# Altium footprint library 我的元件库02.PcbLib: 300 footprints (part 2 of 19)
Each footprint in its own frame and in the unit in brackets; x right, y up, seen from the top. Pads: shape width x height; smd on the part's side, far side on the other; paste and mask are expansions set on the pad; w line width, h text height; cw(c..) or ccw(c..) is an arc to the next point about the centre after c.
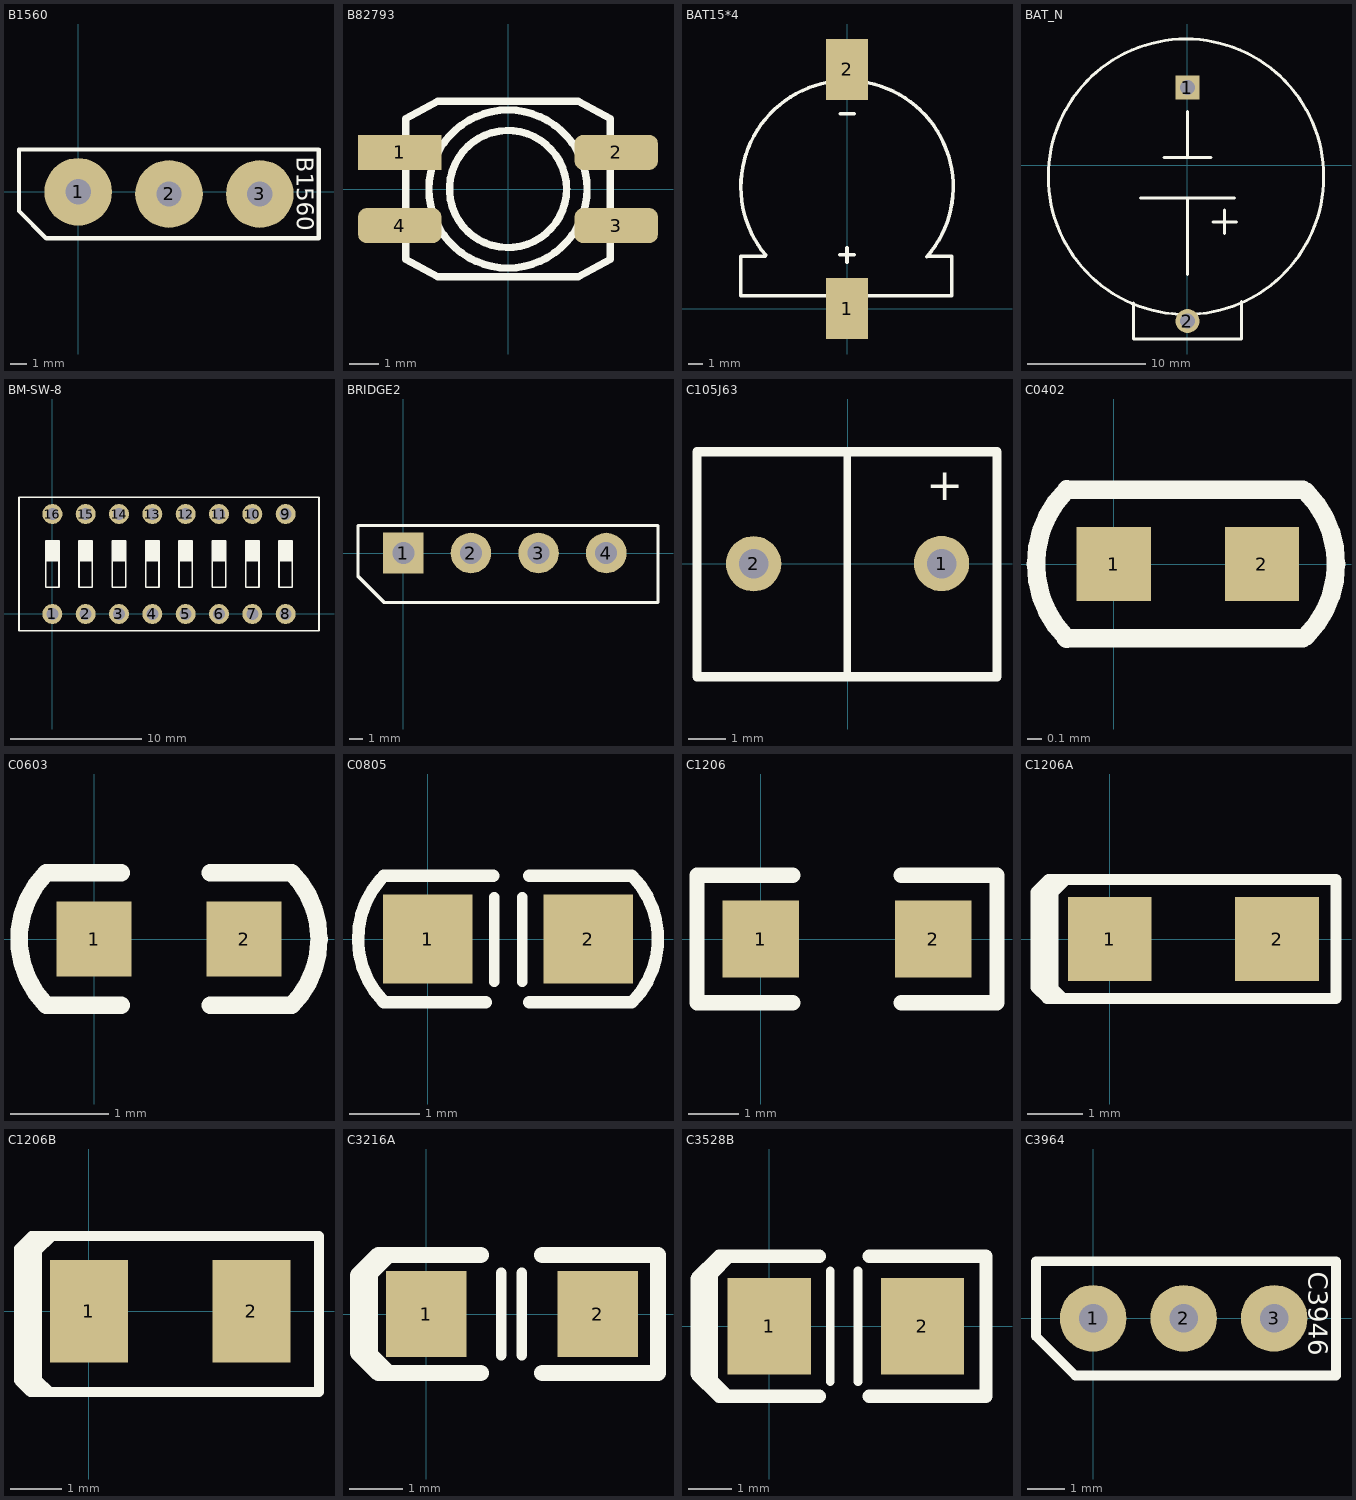
[diagram p1: the footprints below, top view; thin cyan lines are the x and y axes]

## B1560 [mil]
pads (3):
  round 160 hole 60: 1(0,0) 2(215,-5) 3(430,-5)
Top Overlay:
  lines w3.15: 565,100 570,95
  lines w10: -140,99.75 -140,-45.38 -75.38,-110 568.98,-110 ; -139.75,100 569.49,100 ; -85.13,100 569.49,100 ; 569.49,-109.49 569.49,100
  text "B1560" at 517.87,83.62 h40
Bottom Overlay:
  lines w3.15: 565,100 570,95
  lines w10: -140,99.75 -140,-45.38 -75.38,-110 568.98,-110 ; -139.75,100 569.49,100 ; -85.13,100 569.49,100 ; 569.49,-109.49 569.49,100

## B82793 [mm] "CAN总线滤波器"
height 4.8
pads (4):
  rect 2.85x1.2 smd: 1(-3.7,1.25)
  rrect50% 2.85x1.2 smd: 2(3.7,1.25) 3(3.7,-1.25) 4(-3.7,-1.25)
Top Overlay:
  circle w0.254: c0,0 r2.7
  circle w0.254: c0,0 r2
  lines w0.254: -3.5,-2.4 -2.4,-3 2.4,-3 3.5,-2.4 3.5,2.4 2.4,3 -2.4,3 -3.5,2.4 -3.5,-2.4

## BAT15*4 [mm]
pads (2):
  rect 3x4.3 smd: 1(0,0) 2(0,16.9)
Top Overlay:
  lines w0.254: -5.789,3.7 -7.5,3.7 -7.5,0.9 7.4,0.9 7.4,3.7 5.687,3.7 ; -5.731,3.758 cw(c0,8.6) 5.646,3.659 ; -0.508,3.8 0.508,3.8 ; -0.491,13.775 0.525,13.775 ; 0,3.292 0,4.308

## BAT_N [mil] "CR2032电池座（未加焊）"
pads (2):
  rect 80x80 hole 50: 1(0.21,260.42)
  round 80 hole 50: 2(0.21,-519.58)
Top Overlay:
  circle w10: c-4.79,-37.58 r460
  lines w10: -179.79,-459.58 -179.79,-579.58 180.21,-579.58 180.21,-453.58 ; -156.79,-108.58 157.21,-108.58 ; -77.79,27.34 78.21,27.34 ; 0.21,-364.58 0.21,-108.58 ; 0.21,28.73 0.21,180.42 ; 85.43,-188.34 164.43,-188.34 ; 124.43,-227.34 124.43,-148.34
3D body: height 301.57, standoff -181.11, extent -435.69,-565.55 435.69,385.94

## BM-SW-8 [mil]
pads (16):
  round 60 hole 36: 1(0,0) 2(100,0) 3(200,0) 4(300,0) 5(400,0) 6(500,0) 7(600,0) 8(700,0) 9(700,300) 10(600,300) 11(500,300) 12(400,300) 13(300,300) 14(200,300) 15(100,300) 16(0,300)
Top Overlay:
  rectangle: 280,160 320,220
  rectangle: 180,160 220,220
  rectangle: 80,160 120,220
  rectangle: -20,160 20,220
  rectangle: 580,160 620,220
  rectangle: 480,160 520,220
  rectangle: 380,160 420,220
  rectangle: 280,160 320,220
  rectangle: 680,160 720,220
  rectangle: 580,160 620,220
  lines w5: -20,160 20,160 ; 80,160 120,160 ; 180,160 220,160 ; 200,-50 700,-50 ; 200,350 700,350 ; 380,160 420,160 ; 400,-50 -100,-50 -100,350 400,350 ; 480,160 520,160 ; 500,-50 800,-50 800,350 500,350 ; 680,160 720,160 ; 280,80 320,80 ; 280,80 280,220 ; 280,80 320,80 ; 280,80 280,220 ; 280,220 320,220 ; 280,220 320,220 ; 320,80 320,220 ; 320,80 320,220 ; 580,80 620,80 ; 580,80 580,220 ; 580,80 620,80 ; 580,80 580,220 ; 580,220 620,220 ; 580,220 620,220 ; 620,80 620,220 ; 620,80 620,220 ; 680,80 720,80 ; 680,80 680,220 ; 680,80 720,80 ; 680,80 680,220 ; 680,220 720,220 ; 680,220 720,220 ; 720,80 720,220 ; 720,80 720,220 ; -20,80 20,80 20,220 -20,220 -20,80 ; 80,80 120,80 120,220 80,220 80,80 ; 180,80 220,80 220,220 180,220 180,80 ; 280,160 320,160 280,160 ; 380,80 420,80 420,220 380,220 380,80 ; 480,80 520,80 520,220 480,220 480,80 ; 580,160 620,160 580,160
3D body: height 275.59, standoff 0, extent -83.07,-47 783.07,346.7

## BRIDGE2 [mil]
pads (4):
  rect 120x120 hole 65: 1(0,0)
  round 120 hole 65: 2(200,0) 3(400,0) 4(600,0)
Top Overlay:
  lines w9.84: 753.13,-145.87 753.13,81.42
  lines w10: 752.76,-146.24 -56,-146.24 -134,-68.24 -134,81.42 753.13,81.42

## C105J63 [mm]
pads (2):
  round 1.5 hole 0.8: 1(2.546,0.003) 2(-2.546,-0.003)
Top Overlay:
  lines w0.203: -0.003,-3.054 -0.003,3.042
  lines w0.254: -4.079,-3.06 -4.079,-0.012 -4.079,3.036 3.033,3.036 4.049,3.036 4.049,-3.06 -4.079,-3.06
  text "+" at 2.134,1.422 h1.5
3D body: height 7, standoff -2.5, extent -3.581,-2.75 3.619,2.75

## C0402 [mil]
pads (2):
  rect 20x20 smd: 1(0,0) 2(40,0)
Top Overlay:
  lines w5: -13,-20 51,-20 ; -12.65,-20.15 cw(c7.5,0) -12.65,20.15 ; -12,20 51,20 ; 51.95,-19.45 ccw(c32.5,0) 51.95,19.45
3D body: height 7.95, standoff 0, extent 1,-11.81 40.37,11.81

## C0603 [mil]
pads (2):
  rect 30x30 smd: 1(0,0) 2(60,0)
Top Overlay:
  lines w7: 10.98,-26.5 -19.02,-26.5 cw(c7.5,0) -19.02,26.52 10.98,26.5 ; 46.52,-26.52 79.02,-26.5 ccw(c52.5,0) 79.02,26.52 46.52,26.5
3D body: height 23.62, standoff 0, extent -1,-16 61.99,15.5

## C0805 [mil]
pads (2):
  rect 50x50 smd: 1(0,0) 2(90,0)
Top Overlay:
  lines w5.91: 37.25,-23.83 37.25,23.41 ; 53,-23.83 53,23.41
  lines w7: -26.39,33.35 ccw(c11.26,0) -25.09,-34.77 ; -24.64,-35.43 32.48,-35.43 ; -24.64,35.43 36.61,35.43 ; 56.82,-35.43 114.17,-35.43 ; 56.82,35.43 114.17,35.43 ; 114.31,-35.57 ccw(c78.74,0) 114.31,35.57
3D body: height 47.24, standoff 0, extent 6,-24 84.74,23.24

## C1206 [mil]
pads (2):
  rect 60x60 smd: 1(0,0) 2(135,0)
Top Overlay:
  lines w12: 25,-50 -50,-50 -50,50 25,50 ; 110,-50 185,-50 185,50 110,50
3D body: height 62.99, standoff 0, extent 5,-32 130.98,30.99

## C1206A [mm]
pads (2):
  rect 1.5x1.5 smd: 1(0,0) 2(3,0)
Top Overlay:
  lines w0.203: -1.143,-0.889 -1.143,0.889 ; -1.016,-0.635 -1.016,-0.888 -0.837,-1.067 -1.116,-1.067 -1.319,-0.864 -1.319,0.838 -1.091,1.067 -1.016,1.067 ; -1.016,0.533 -1.016,0.837 -0.786,1.067 ; -1.016,1.067 -1.016,-1.041 -0.991,-1.067 0.914,-1.067 2.176,-1.067 4.056,-1.067 4.056,1.041 4.056,1.067 2.151,1.067 0.914,1.067 -1.016,1.067
3D body: height 0.95, standoff 0, extent -0.102,-0.813 3.098,0.787

## C1206B [mm]
pads (2):
  rect 1.524x2 smd: 1(0,0) 2(3.175,0)
Top Overlay:
  lines w0.025: -1,-1 -1,1
  lines w0.203: -1.367,-1.21 -1.367,1.124 -1.212,1.2 -1.212,-1.4 -1.143,-1.524 -1.143,1.397 -1.067,1.473 ; -1.367,-0.965 -1.367,-1.351 -1.143,-1.575 ; -1.016,-0.737 -1.016,-1.333 -0.775,-1.575 ; -1.016,0.61 -1.016,1.181 -0.724,1.473 ; 2.134,1.473 4.42,1.473 4.496,1.473 4.496,-1.575 4.445,-1.575 2.159,-1.575 ; 2.73,1.473 0.838,1.473 -1.067,1.473 ; 2.781,-1.575 0.787,-1.575 -1.118,-1.575 -1.143,-1.575 ; -1.143,-1.575 -1.092,-1.575 ; -1.143,-1.575 -1.092,-1.575 ; -1.118,1.473 -1.016,1.473 -1.016,-1.499 -1.092,-1.575 ; -1.118,1.473 -1.367,1.224 -1.367,-1.3 -1.092,-1.575 ; -1.118,1.473 -1.067,1.473 ; -1.118,1.473 -1.067,1.473
3D body: height 0.95, standoff 0, extent 0.025,-0.813 3.225,0.787

## C3216A [mm]
pads (2):
  rect 1.5x1.6 smd: 1(0,0) 2(3.2,0)
Top Overlay:
  lines w0.2: -1.083,-0.822 -1.083,0.906 ; -1,-1 -1,1 ; -1,-0.762 -0.973,-0.762 -0.635,-1.1 ; -1,0.762 -0.973,0.762 -0.635,1.1 ; 1.397,-0.762 1.397,0.762 ; 1.778,-0.762 1.778,0.762
  lines w0.305: 1.016,-1.1 -0.889,-1.1 -1.27,-0.719 -1.27,0.719 -0.889,1.1 1.016,1.1 ; 2.159,-1.1 4.318,-1.1 4.318,1.1 2.159,1.1
3D body: height 1.6, standoff 0, extent 0.051,-0.787 3.251,0.813

## C3528B [mm]
pads (2):
  rect 1.9x2.2 smd: 1(0,0) 2(3.5,0)
Top Overlay:
  lines w0.2: -1.417,-1.25 -1.417,1.326 ; -1.27,-1.397 -1.27,1.179 -0.889,1.56 ; -1.27,-1.143 -1.27,-1.219 -0.889,-1.6 ; 1.397,-1.27 1.397,1.27 ; 2.032,-1.27 2.032,1.27
  lines w0.3: -1.651,-1.092 -1.651,1.092 ; 4.953,-1.6 4.953,1.6
  lines w0.305: -1.651,-1.092 -1.143,-1.6 1.143,-1.6 ; -1.651,1.092 -1.143,1.6 1.143,1.6 ; 2.286,-1.6 4.953,-1.6 ; 2.286,1.6 4.953,1.6
3D body: height 1.9, standoff 0, extent 0.025,-1.397 3.525,1.403

## C3964 [mil]
pads (3):
  round 70 hole 30: 1(0,0) 2(95,0) 3(190,0)
Top Overlay:
  lines w10: -60,-18.84 -18.84,-60 255,-60 255,60 -60,60 -60,-18.84
  text "C3946" at 226.59,49.16 h20
Bottom Overlay:
  lines w10: -60,-18.68 -60,60.16 255,60.16 255,-59.84 -18.84,-59.84 -60,-18.68